# Altium footprint library jointbar.PCBLIB: 166 footprints (part 5 of 11)
Each footprint in its own frame and in the unit in brackets; x right, y up, seen from the top. Pads: shape width x height; smd on the part's side, far side on the other; paste and mask are expansions set on the pad; w line width, h text height; cw(c..) or ccw(c..) is an arc to the next point about the centre after c.
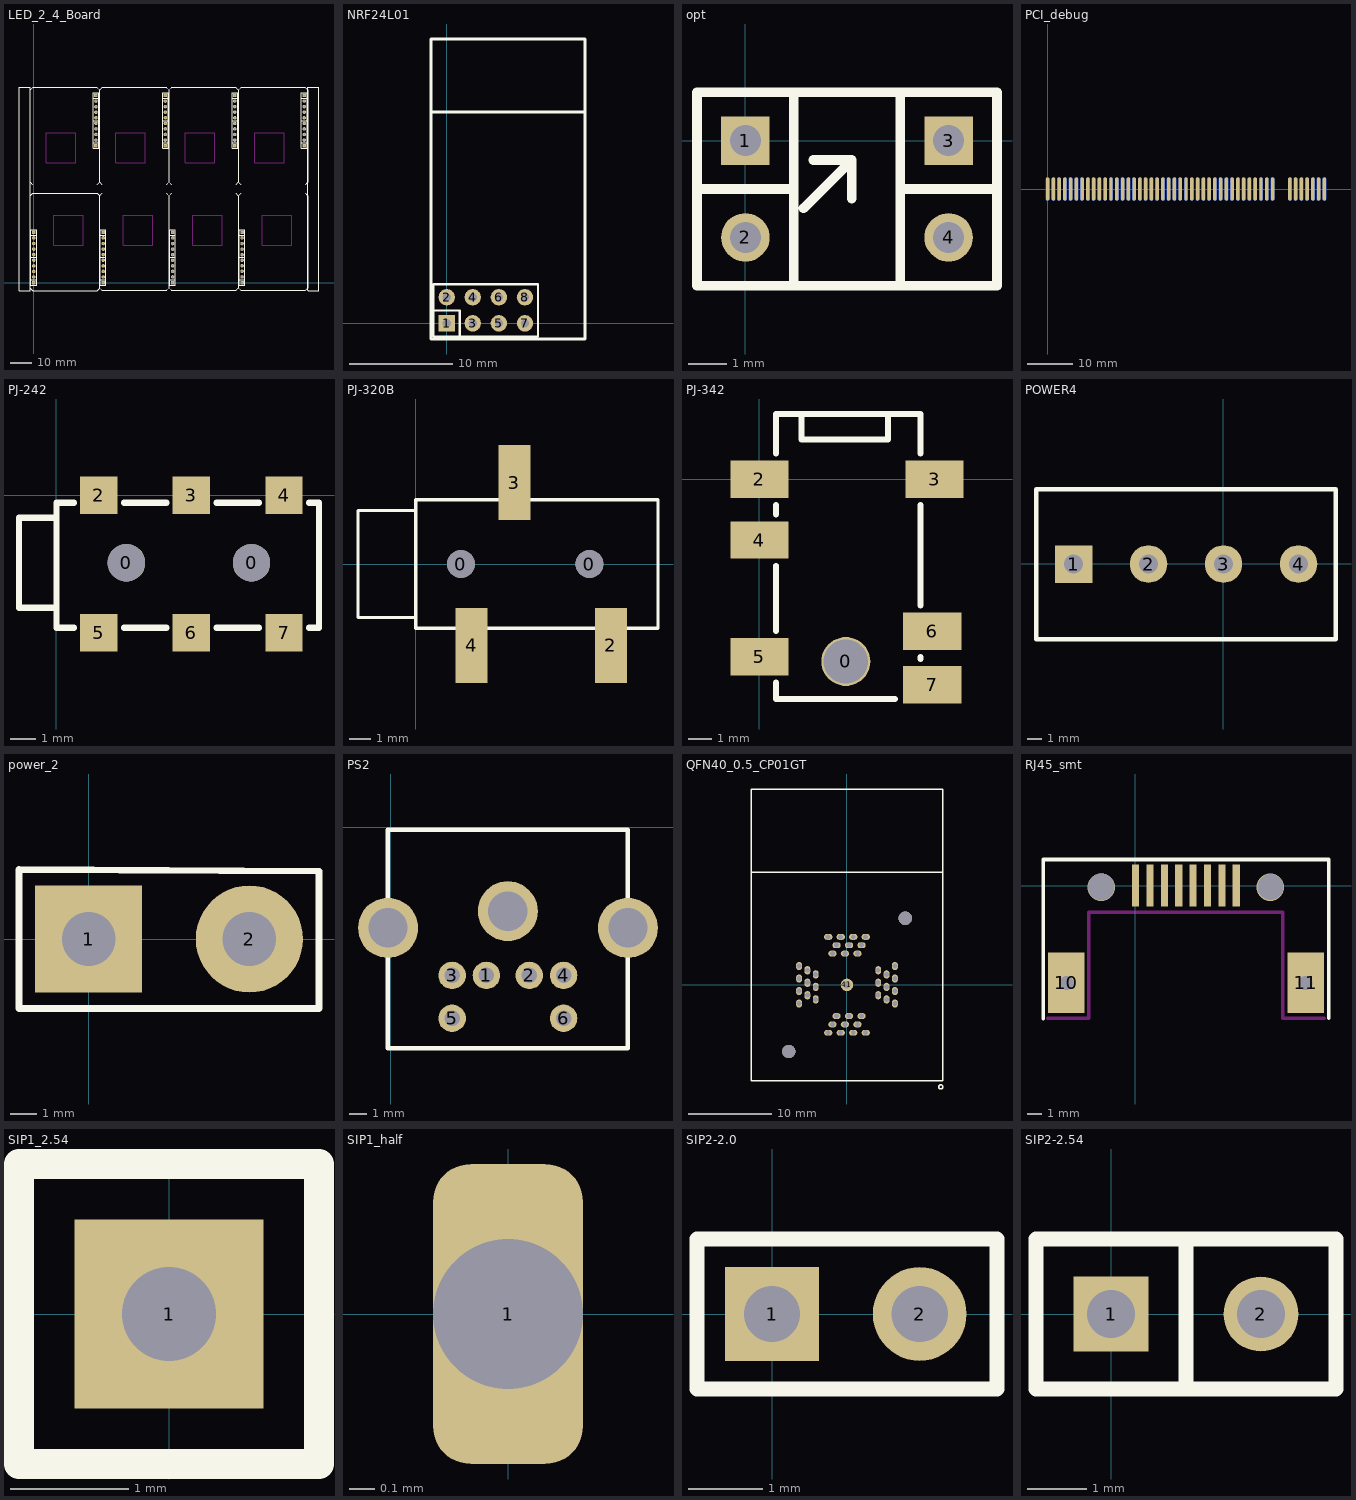
[diagram p4: the footprints below, top view; thin cyan lines are the x and y axes]

## LED_2_4_Board [mm]
pads (80):
  rect 1.6x1.6 hole 0.8: 1_1(0,0) 1_10(0,22.86) 2_1(31.623,0) 2_10(31.623,22.86) 3_1(63.246,0) 3_10(63.246,22.86) 4_1(94.869,0) 4_10(94.869,22.86) 5_1(123.19,85.217) 5_10(123.19,62.357) 6_1(91.567,85.217) 6_10(91.567,62.357) 7_1(59.944,85.217) 7_10(59.944,62.357) 8_1(28.321,85.217) 8_10(28.321,62.357)
  round 1.6 hole 0.8: 1_2(0,2.54) 1_3(0,5.08) 1_4(0,7.62) 1_5(0,10.16) 1_6(0,12.7) 1_7(0,15.24) 1_8(0,17.78) 1_9(0,20.32) 2_2(31.623,2.54) 2_3(31.623,5.08) 2_4(31.623,7.62) 2_5(31.623,10.16) 2_6(31.623,12.7) 2_7(31.623,15.24) 2_8(31.623,17.78) 2_9(31.623,20.32) 3_2(63.246,2.54) 3_3(63.246,5.08) 3_4(63.246,7.62) 3_5(63.246,10.16) 3_6(63.246,12.7) 3_7(63.246,15.24) 3_8(63.246,17.78) 3_9(63.246,20.32) 4_2(94.869,2.54) 4_3(94.869,5.08) 4_4(94.869,7.62) 4_5(94.869,10.16) 4_6(94.869,12.7) 4_7(94.869,15.24) 4_8(94.869,17.78) 4_9(94.869,20.32) 5_2(123.19,82.677) 5_3(123.19,80.137) 5_4(123.19,77.597) 5_5(123.19,75.057) 5_6(123.19,72.517) 5_7(123.19,69.977) 5_8(123.19,67.437) 5_9(123.19,64.897) 6_2(91.567,82.677) 6_3(91.567,80.137) 6_4(91.567,77.597) 6_5(91.567,75.057) 6_6(91.567,72.517) 6_7(91.567,69.977) 6_8(91.567,67.437) 6_9(91.567,64.897) 7_2(59.944,82.677) 7_3(59.944,80.137) 7_4(59.944,77.597) 7_5(59.944,75.057) 7_6(59.944,72.517) 7_7(59.944,69.977) 7_8(59.944,67.437) 7_9(59.944,64.897) 8_2(28.321,82.677) 8_3(28.321,80.137) 8_4(28.321,77.597) 8_5(28.321,75.057) 8_6(28.321,72.517) 8_7(28.321,69.977) 8_8(28.321,67.437) 8_9(28.321,64.897)
TopOverlay:
  drawing of 432 lines, arcs and shapes, not listed
KeepOutLayer:
  lines w0.254: 5.715,54.61 19.177,54.61 19.177,68.326 5.715,68.326 5.715,54.61 ; 9.144,17.018 9.144,30.734 22.606,30.734 22.606,17.018 9.144,17.018 ; 37.338,54.61 50.8,54.61 50.8,68.326 37.338,68.326 37.338,54.61 ; 40.767,17.018 54.229,17.018 54.229,30.734 40.767,30.734 40.767,17.018 ; 68.961,54.61 82.423,54.61 82.423,68.326 68.961,68.326 68.961,54.61 ; 72.39,17.018 85.852,17.018 85.852,30.734 72.39,30.734 72.39,17.018 ; 100.584,54.61 114.046,54.61 114.046,68.326 100.584,68.326 100.584,54.61 ; 104.013,17.018 117.475,17.018 117.475,30.734 104.013,30.734 104.013,17.018

## NRF24L01 [mm]
pads (8):
  rect 1.6x1.6 hole 0.8: 1(0,0)
  round 1.6 hole 0.8: 2(0,2.54) 3(2.54,0) 4(2.54,2.54) 5(5.08,0) 6(5.08,2.54) 7(7.62,0) 8(7.62,2.54)
TopOverlay:
  lines w0.203: -1.27,1.27 1.27,1.27 1.27,-1.27 ; -1.27,-1.27 -1.27,3.81 8.89,3.81 8.89,-1.27 -1.27,-1.27
  lines w0.254: -1.524,20.574 13.462,20.574 ; -1.524,-1.524 -1.524,-1.27 -1.524,27.686 13.462,27.686 13.462,-1.524 -1.524,-1.524

## opt [mil]
pads (4):
  rect 50x50 hole 32: 1(0,0) 3(210,0)
  round 50 hole 32: 2(0,-100) 4(210,-100)
TopOverlay:
  lines w10: -50,-50 50,-50 ; 50,-150 50,50 ; 60,-70 110,-20 ; 70,-20 110,-20 ; 110,-60 110,-20 ; 160,-50 260,-50 ; 50,50 160,50 ; 50,50 -50,50 -50,-150 160,-150 ; 160,-150 260,-150 260,50 160,50 ; 160,-150 160,50

## PCI_debug [mil]
pads (94):
  oval 30x200 smd: A10(0,0) A11(50,0) A12(100,0) A13(150,0) A14(200,0) A15(250,0) A16(300,0) A17(350,0) A18(400,0) A19(450,0) A20(500,0) A21(550,0) A22(600,0) A23(650,0) A24(700,0) A25(750,0) A26(800,0) A27(850,0) A28(900,0) A29(950,0) A30(1000,0) A31(1050,0) A32(1100,0) A33(1150,0) A34(1200,0) A35(1250,0) A36(1300,0) A37(1350,0) A38(1400,0) A39(1450,0) A40(1500,0) A41(1550,0) A42(1600,0) A43(1650,0) A44(1700,0) A45(1750,0) A46(1800,0) A47(1850,0) A48(1900,0) A49(1950,0) A52(2100,0) A53(2150,0) A54(2200,0) A55(2250,0) A56(2300,0) A57(2350,0) A58(2400,0)
  oval 30x200 smd far side: B10(0,0) B11(50,0) B12(100,0) B13(150,0) B14(200,0) B15(250,0) B16(300,0) B17(350,0) B18(400,0) B19(450,0) B20(500,0) B21(550,0) B22(600,0) B23(650,0) B24(700,0) B25(750,0) B26(800,0) B27(850,0) B28(900,0) B29(950,0) B30(1000,0) B31(1050,0) B32(1100,0) B33(1150,0) B34(1200,0) B35(1250,0) B36(1300,0) B37(1350,0) B38(1400,0) B39(1450,0) B40(1500,0) B41(1550,0) B42(1600,0) B43(1650,0) B44(1700,0) B45(1750,0) B46(1800,0) B47(1850,0) B48(1900,0) B49(1950,0) B52(2100,0) B53(2150,0) B54(2200,0) B55(2250,0) B56(2300,0) B57(2350,0) B58(2400,0)

## PJ-242 [mm]
pads (8):
  round 1.5 hole 1.5: 0(2.8,-2.7) 0(7.8,-2.7)
  rect 1.5x1.5 smd: 2(1.7,0) 3(5.4,0) 4(9.1,0) 5(1.7,-5.5) 6(5.4,-5.5) 7(9.1,-5.5)
TopOverlay:
  lines w0.254: 0,-4.5 -1.5,-4.5 -1.5,-0.9 0,-0.9 ; 0.7,-5.3 0,-5.3 0,-0.3 0.7,-0.3 ; 2.7,-5.3 4.4,-5.3 ; 2.7,-0.3 4.4,-0.3 ; 6.4,-5.3 8.1,-5.3 ; 6.4,-0.3 8.1,-0.3 ; 10.1,-5.3 10.5,-5.3 10.5,-0.3 10.1,-0.3
3D body: height 3.2, standoff 0, extent -0.05,-5.3 10.45,-0.3
3D body: height 3.6, standoff -0.4, extent -1.55,-4.799 -0.05,-0.8

## PJ-320B [mm]
pads (5):
  round 1.3 hole 1.3: 0(2.1,0) 0(8.1,0)
  rect 1.5x3.5 smd: 2(9.1,-3.8) 3(4.6,3.8) 4(2.6,-3.8)
TopOverlay:
  lines w0.152: 0,-2.5 -2.7,-2.5 -2.7,2.5 0,2.5 0,-3 11.3,-3 11.3,3 0,3 0,2.1
3D body: height 5, standoff 0, extent 0,-3 11.3,3
3D body: height 5, standoff 0, extent -2.7,-2.5 0,2.5
3D body: height 0.2, standoff 0, extent 2.1,-5.2 3.1,-3
3D body: height 0.2, standoff 0, extent 8.6,-5.2 9.6,-3
3D body: height 0.2, standoff 0, extent 4.1,3 5.1,5.2

## PJ-342 [mm]
pads (7):
  round 2.1 hole 1.9: 0(3.7,-7.8)
  rect 2.5x1.6 smd: 2(0,0) 3(7.5,0) 4(0,-2.6) 5(0,-7.6) 6(7.4,-6.5) 7(7.4,-8.8)
TopOverlay:
  lines w0.254: 0.7,-8.7 0.7,-9.4 5.8,-9.4 ; 0.7,-6.5 0.7,-3.7 ; 0.7,-1.5 0.7,-1.1 ; 0.7,1.1 0.7,2.8 6.9,2.8 6.9,1.1 ; 1.8,2.8 1.8,1.7 3.9,1.7 5.5,1.7 5.5,2.8 ; 6.9,-7.7 6.9,-7.6 ; 6.9,-5.4 6.9,-1.1
3D body: height 3.2, standoff 0, extent 0.762,-9.271 6.858,2.667
3D body: height 3.6, standoff -0.4, extent 1.716,2.691 5.715,4.191

## POWER4 [mm]
pads (4):
  rect 2.54x2.54 hole 1.27: 1(-10.148,-0.006)
  round 2.54 hole 1.27: 2(-5.068,-0.006) 3(0.012,-0.006) 4(5.092,-0.006)
TopOverlay:
  lines w0.305: -12.688,-5.086 -12.688,5.074 7.632,5.074 7.632,-5.086 -12.688,-5.086

## power_2 [mm]
pads (2):
  rect 4x4 hole 2: 1(0,0)
  round 4 hole 2: 2(6,0)
TopOverlay:
  lines w0.254: -2.6,-2.6 8.6,-2.6 8.6,2.526 -2.6,2.6 -2.6,-2.6

## PS2 [mil]
pads (9):
  round 63 hole 35.5: 1(220,-340) 2(318.42,-340) 3(141.26,-340) 4(397.16,-340) 5(141.26,-438.42) 6(397.16,-438.42)
  round 137.79 hole 90.55: ""(-6,-231) ""(269.21,-192.36) ""(545,-231)
TopOverlay:
  lines w10: -6.38,-507.32 544.8,-507.32 544.8,-5.35 -6.38,-5.35 -6.38,-507.32

## QFN40_0.5_CP01GT [mm]
pads (41):
  oval 0.7x1 hole 0.6: 1(5.75,-2.25) 2(4.75,-1.75) 3(3.75,-1.25) 4(5.75,-0.75) 5(4.75,-0.25) 6(3.75,0.25) 7(5.75,0.75) 8(4.75,1.25) 9(3.75,1.75) 10(5.75,2.25) 21(-5.75,2.25) 22(-4.75,1.75) 23(-3.75,1.25) 24(-5.75,0.75) 25(-4.75,0.25) 26(-3.75,-0.25) 27(-5.75,-0.75) 28(-4.75,-1.25) 29(-3.75,-1.75) 30(-5.75,-2.25)
  oval 1x0.7 hole 0.6: 11(2.25,5.75) 12(1.75,4.75) 13(1.25,3.75) 14(0.75,5.75) 15(0.25,4.75) 16(-0.25,3.75) 17(-0.75,5.75) 18(-1.25,4.75) 19(-1.75,3.75) 20(-2.25,5.75) 31(-2.25,-5.75) 32(-1.75,-4.75) 33(-1.25,-3.75) 34(-0.75,-5.75) 35(-0.25,-4.75) 36(0.25,-3.75) 37(0.75,-5.75) 38(1.25,-4.75) 39(1.75,-3.75) 40(2.25,-5.75)
  round 1.5 hole 0.9: 41(0,0)
via -7,-8 diameter 1.6 hole 1.6
via 7,8 diameter 1.6 hole 1.6
TopOverlay:
  circle w0.152: c11.25,-12.25 r0.25
  lines w0.152: -11.5,13.5 -11.5,23.5 11.5,23.5 11.5,13.5 ; -11.5,13.5 -11.5,-11.5 11.5,-11.5 11.5,13.5 ; -11.5,13.5 11.5,13.5

## RJ45_smt [mm]
pads (10):
  rect 0.5x3 smd: 1(0,0) 2(1.025,0) 3(2.05,0) 4(3.075,0) 5(4.075,0) 6(5.1,0) 7(6.125,0) 8(7.15,0)
  rect 2.6x4.3 hole 1: 10(-4.9,-6.9) 11(12.075,-6.9)
via -2.425,-0.1 diameter 1.95 hole 1.9
via 9.575,-0.1 diameter 1.95 hole 1.85
TopOverlay:
  lines w0.254: -6.525,-9.425 -6.525,1.85 ; 13.7,-9.4 13.7,1.825 ; 13.7,1.85 -6.525,1.85 ; -6.525,1.85 -6.525,1.85
KeepOutLayer:
  lines w0.254: -6.2,-9.4 -3.3,-9.4 -3.3,-1.9 10.45,-1.9 10.45,-9.4 13.375,-9.4
3D body "SW3dPS-RJ45 SMT 440209 AMP.STEP": height 8.69, standoff -2.8, extent -5.545,-12.45 12.895,0.85

## SIP1_2.54 [mm]
pads (1):
  rect 1.6x1.6 hole 0.8: 1(0,0)
TopOverlay:
  lines w0.254: -1.27,-1.27 1.27,-1.27 1.27,1.27 -1.27,1.27 -1.27,-1.27

## SIP1_half [mm]
pads (1):
  rrect50% 0.6x1.2 hole 0.6: 1(0,0)

## SIP2-2.0 [mil]
pads (2):
  rect 50x50 hole 30: 1(0,0)
  round 50 hole 30: 2(78.74,0)
TopOverlay:
  lines w8: -40,-40 -40,40 120,40 120,-40 -40,-40

## SIP2-2.54 [mil]
pads (2):
  rect 50x50 hole 32: 1(0,0)
  round 50 hole 32: 2(100,0)
TopOverlay:
  lines w10: 50,-50 50,50 ; -50,-50 -50,50 150,50 150,-50 -50,-50